# Altium footprint library PCB_ConnectorHDR.PcbLib: 221 footprints (part 6 of 14)
Each footprint in its own frame and in the unit in brackets; x right, y up, seen from the top. Pads: shape width x height; smd on the part's side, far side on the other; paste and mask are expansions set on the pad; w line width, h text height; cw(c..) or ccw(c..) is an arc to the next point about the centre after c.
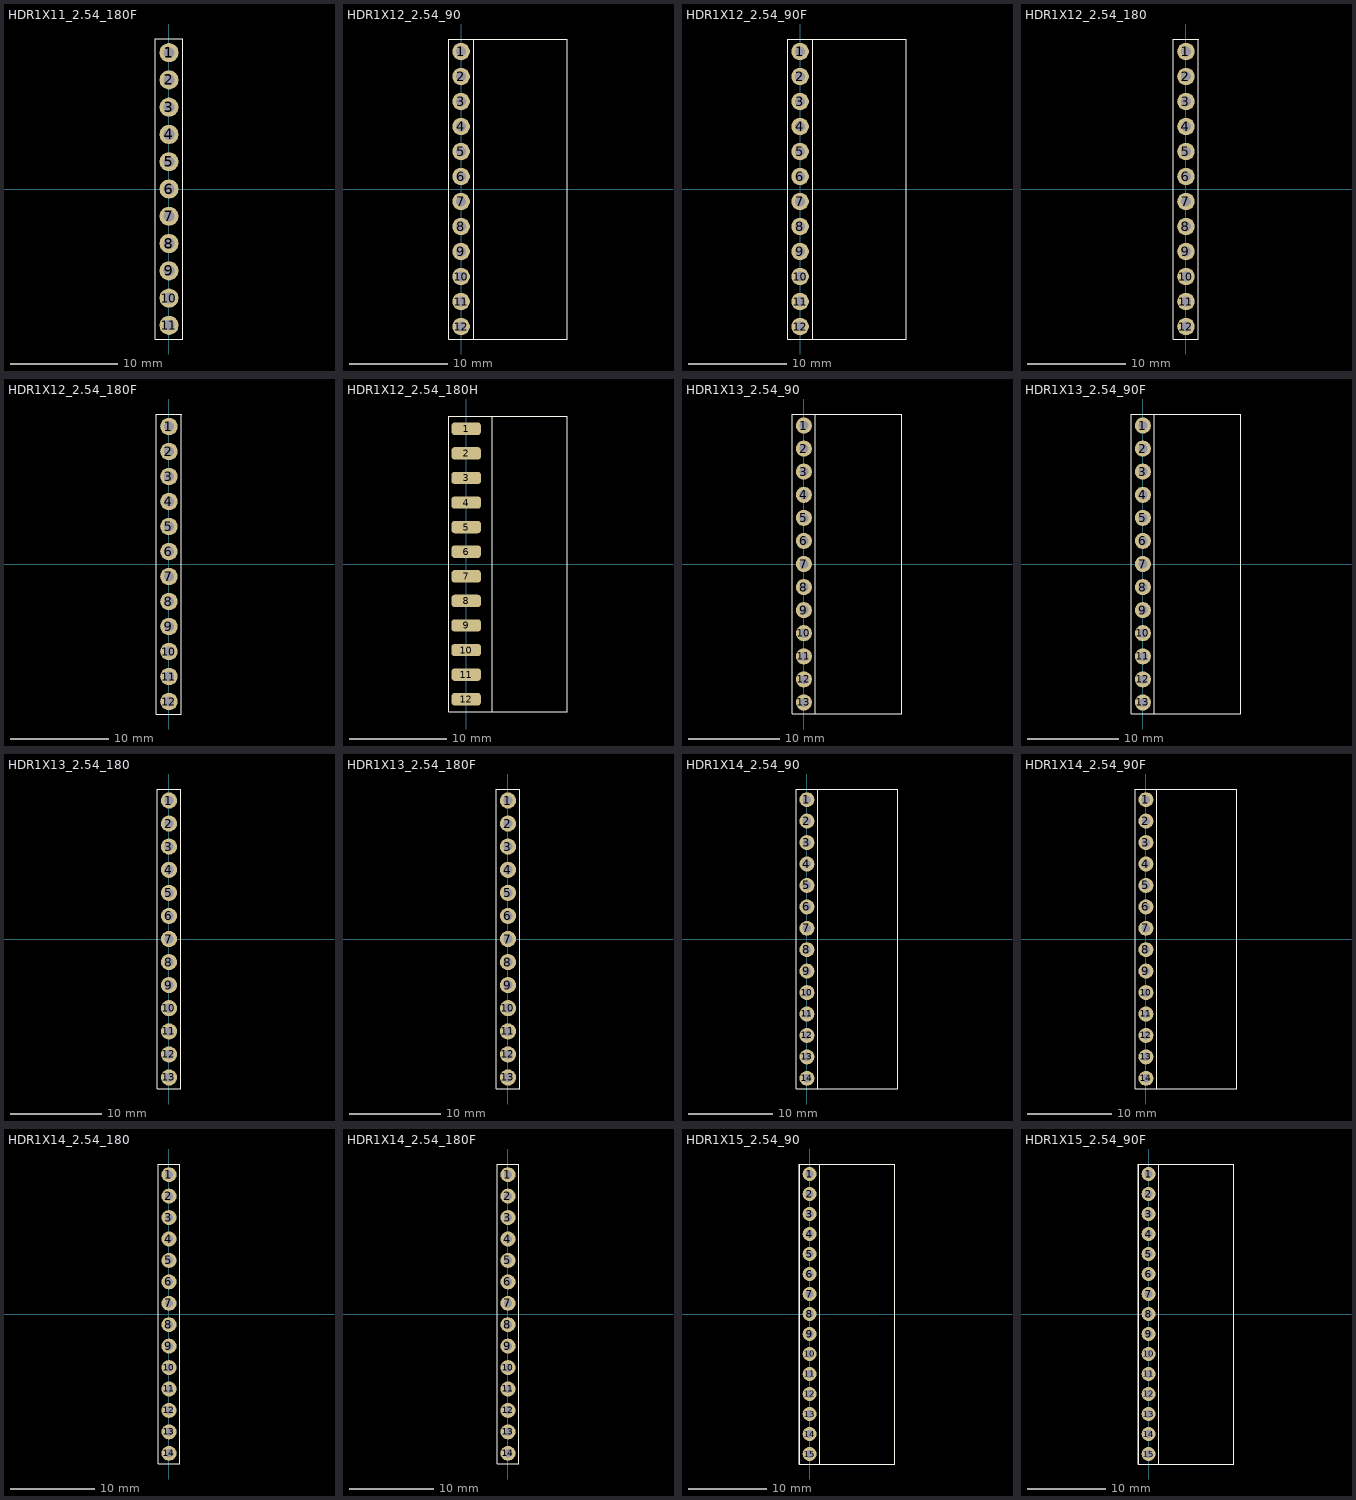
[diagram p5: the footprints below, top view; thin cyan lines are the x and y axes]

## HDR1X11_2.54_180F [mil]
height 169.29
pads (11):
  round 70 hole 39.37: 1(0,500) 2(0,400) 3(0,300) 4(0,200) 5(0,100) 6(0,0) 7(0,-100) 8(0,-200) 9(0,-300) 10(0,-400) 11(0,-500)
Top Overlay:
  lines w2: -50,-550 -50,550 ; -50,-550 50,-550 ; -50,-550 -50,550 ; -50,-550 50,-550 ; -50,550 50,550 ; -50,550 50,550 ; 50,-550 50,550 ; 50,-550 50,550
3D body "female_header_a-bl254-eg-g11d.stp": height 334.65, standoff -125.98, extent -49.21,-554.84 49.21,555

## HDR1X12_2.54_90 [mil]
height 169.29
pads (12):
  round 70 hole 39.37: 1(0,550) 2(0,450) 3(0,350) 4(0,250) 5(0,150) 6(0,50) 7(0,-50) 8(0,-150) 9(0,-250) 10(0,-350) 11(0,-450) 12(0,-550)
Top Overlay:
  lines w2: -50,-600 425,-600 425,600 -50,600 ; -50,-600 -50,600 ; -50,-600 50,-600 50,600 -50,600 ; -50,-600 -50,600
3D body "pin_header_aw140-ea-g12g.stp": height 99.21, standoff -93.7, extent -15,-596.06 423.58,596.06

## HDR1X12_2.54_90F [mil]
height 169.29
pads (12):
  round 70 hole 39.37: 1(0,550) 2(0,450) 3(0,350) 4(0,250) 5(0,150) 6(0,50) 7(0,-50) 8(0,-150) 9(0,-250) 10(0,-350) 11(0,-450) 12(0,-550)
Top Overlay:
  lines w2: -50,-600 425,-600 425,600 -50,600 ; -50,-600 -50,600 ; -50,-600 50,-600 50,600 -50,600 ; -50,-600 -50,600
3D body "female_header_a-bl254-ea-g12d.stp": height 98.93, standoff -125.48, extent -9,-604.84 387.06,605

## HDR1X12_2.54_180 [mil]
height 169.29
pads (12):
  round 70 hole 39.37: 1(0,550) 2(0,450) 3(0,350) 4(0,250) 5(0,150) 6(0,50) 7(0,-50) 8(0,-150) 9(0,-250) 10(0,-350) 11(0,-450) 12(0,-550)
Top Overlay:
  lines w2: -50,-600 50,-600 ; -50,-600 -50,600 ; -50,-600 50,-600 ; -50,-600 -50,600 ; -50,600 50,600 ; -50,600 50,600 ; 50,-600 50,600 ; 50,-600 50,600
3D body "pin_header_aw140-eg-g12d.stp": height 322.83, standoff -118.11, extent -49.18,-600 49.18,600

## HDR1X12_2.54_180F [mil]
height 169.29
pads (12):
  round 70 hole 39.37: 1(0,550) 2(0,450) 3(0,350) 4(0,250) 5(0,150) 6(0,50) 7(0,-50) 8(0,-150) 9(0,-250) 10(0,-350) 11(0,-450) 12(0,-550)
Top Overlay:
  lines w2: -50,-600 50,-600 ; -50,-600 -50,600 ; -50,-600 50,-600 ; -50,-600 -50,600 ; -50,600 50,600 ; -50,600 50,600 ; 50,-600 50,600 ; 50,-600 50,600
3D body "female_header_a-bl254-eg-g12d.stp": height 334.65, standoff -125.98, extent -49.21,-604.92 49.21,604.92

## HDR1X12_2.54_180H [mil]
height 169.29
pads (12):
  rrect50% 120x50 smd: 1(0,550) 2(0,450) 3(0,350) 4(0,250) 5(0,150) 6(0,50) 7(0,-50) 8(0,-150) 9(0,-250) 10(0,-350) 11(0,-450) 12(0,-550)
Top Overlay:
  lines w2: -70,-600 410,-600 410,600 -70,600 ; -70,-600 -70,600 ; -70,-600 -70,600 ; -70,-600 105,-600 105,600 -70,600
3D body "pin_header_aw140-eg-g12d.stp": height 49.32, standoff -49.05, extent -35,-600 405.94,600

## HDR1X13_2.54_90 [mil]
height 169.29
pads (13):
  round 70 hole 39.37: 1(0,600) 2(0,500) 3(0,400) 4(0,300) 5(0,200) 6(0,100) 7(0,0) 8(0,-100) 9(0,-200) 10(0,-300) 11(0,-400) 12(0,-500) 13(0,-600)
Top Overlay:
  lines w2: -51,-450 -51,650 ; -51,650 -51,-650 425,-650 425,650 -51,650 ; -50,-650 -50,650 ; -50,-650 50,-650 ; -50,-650 -50,650 ; -50,-650 50,-650 ; -50,650 50,650 ; -50,650 50,650 ; 50,-650 50,650 ; 50,-650 50,650
3D body "pin_header_aw140-ea-g13g.stp": height 98.93, standoff -93.99, extent -12,-646.13 426.58,646

## HDR1X13_2.54_90F [mil]
height 169.29
pads (13):
  round 70 hole 39.37: 1(0,600) 2(0,500) 3(0,400) 4(0,300) 5(0,200) 6(0,100) 7(0,0) 8(0,-100) 9(0,-200) 10(0,-300) 11(0,-400) 12(0,-500) 13(0,-600)
Top Overlay:
  lines w2: -51,-450 -51,650 ; -51,650 -51,-650 425,-650 425,650 -51,650 ; -50,-650 -50,650 ; -50,-650 50,-650 ; -50,-650 -50,650 ; -50,-650 50,-650 ; -50,650 50,650 ; -50,650 50,650 ; 50,-650 50,650 ; 50,-650 50,650
3D body "female_header_a-bl254-ea-g13d.stp": height 98.93, standoff -125.48, extent -8,-655.84 388.06,654

## HDR1X13_2.54_180 [mil]
height 169.29
pads (13):
  round 70 hole 39.37: 1(0,600) 2(0,500) 3(0,400) 4(0,300) 5(0,200) 6(0,100) 7(0,0) 8(0,-100) 9(0,-200) 10(0,-300) 11(0,-400) 12(0,-500) 13(0,-600)
Top Overlay:
  lines w2: -50,-650 -50,650 ; -50,-650 50,-650 ; -50,-650 50,-650 ; -50,-650 -50,650 ; -50,650 50,650 ; -50,650 50,650 ; 50,-650 50,650 ; 50,-650 50,650
3D body "pin_header_aw140-eg-g13d.stp": height 322.83, standoff -118.11, extent -49.18,-650 49.18,650

## HDR1X13_2.54_180F [mil]
height 169.29
pads (13):
  round 70 hole 39.37: 1(0,600) 2(0,500) 3(0,400) 4(0,300) 5(0,200) 6(0,100) 7(0,0) 8(0,-100) 9(0,-200) 10(0,-300) 11(0,-400) 12(0,-500) 13(0,-600)
Top Overlay:
  lines w2: -50,-650 50,-650 ; -50,-650 -50,650 ; -50,-650 -50,650 ; -50,-650 50,-650 ; -50,650 50,650 ; -50,650 50,650 ; 50,-650 50,650 ; 50,-650 50,650
3D body "female_header_a-bl254-eg-g13d.stp": height 334.65, standoff -125.98, extent -49.2,-654.91 49.22,654.92

## HDR1X14_2.54_90 [mil]
height 169.29
pads (14):
  round 70 hole 39.37: 1(0,650) 2(0,550) 3(0,450) 4(0,350) 5(0,250) 6(0,150) 7(0,50) 8(0,-50) 9(0,-150) 10(0,-250) 11(0,-350) 12(0,-450) 13(0,-550) 14(0,-650)
Top Overlay:
  lines w2: -51,-400 -51,700 ; -51,700 425,700 425,-700 -51,-700 -51,700 ; -50,-700 50,-700 ; -50,-700 -50,700 ; -50,-700 50,-700 ; -50,-700 -50,700 ; -50,700 50,700 ; -50,700 50,700 ; 50,-700 50,700 ; 50,-700 50,700
3D body "pin_header_aw140-ea-g14g.stp": height 98.93, standoff -93.99, extent -12.96,-696.06 425.62,696.07

## HDR1X14_2.54_90F [mil]
height 169.29
pads (14):
  round 70 hole 39.37: 1(0,650) 2(0,550) 3(0,450) 4(0,350) 5(0,250) 6(0,150) 7(0,50) 8(0,-50) 9(0,-150) 10(0,-250) 11(0,-350) 12(0,-450) 13(0,-550) 14(0,-650)
Top Overlay:
  lines w2: -51,-400 -51,700 ; -51,700 -51,-700 425,-700 425,700 -51,700 ; -50,-700 -50,700 ; -50,-700 50,-700 ; -50,-700 -50,700 ; -50,-700 50,-700 ; -50,700 50,700 ; -50,700 50,700 ; 50,-700 50,700 ; 50,-700 50,700
3D body "female_header_a-bl254-ea-g14d.stp": height 98.93, standoff -125.48, extent -7,-704.84 389.06,705

## HDR1X14_2.54_180 [mil]
height 169.29
pads (14):
  round 70 hole 39.37: 1(0,650) 2(0,550) 3(0,450) 4(0,350) 5(0,250) 6(0,150) 7(0,50) 8(0,-50) 9(0,-150) 10(0,-250) 11(0,-350) 12(0,-450) 13(0,-550) 14(0,-650)
Top Overlay:
  lines w2: -50,-700 -50,700 ; -50,-700 50,-700 ; -50,-700 -50,700 ; -50,-700 50,-700 ; -50,700 50,700 ; -50,700 50,700 ; 50,-700 50,700 ; 50,-700 50,700
3D body "pin_header_aw140-eg-g14d.stp": height 322.83, standoff -118.11, extent -49.18,-700 49.18,700

## HDR1X14_2.54_180F [mil]
height 169.29
pads (14):
  round 70 hole 39.37: 1(0,650) 2(0,550) 3(0,450) 4(0,350) 5(0,250) 6(0,150) 7(0,50) 8(0,-50) 9(0,-150) 10(0,-250) 11(0,-350) 12(0,-450) 13(0,-550) 14(0,-650)
Top Overlay:
  lines w2: -50,-700 50,-700 ; -50,-700 -50,700 ; -50,-700 50,-700 ; -50,-700 -50,700 ; -50,700 50,700 ; -50,700 50,700 ; 50,-700 50,700 ; 50,-700 50,700
3D body "female_header_a-bl254-eg-g14d.stp": height 334.65, standoff -125.98, extent -49.21,-704.84 49.21,705

## HDR1X15_2.54_90 [mil]
height 169.29
pads (15):
  round 70 hole 39.37: 1(0,700) 2(0,600) 3(0,500) 4(0,400) 5(0,300) 6(0,200) 7(0,100) 8(0,0) 9(0,-100) 10(0,-200) 11(0,-300) 12(0,-400) 13(0,-500) 14(0,-600) 15(0,-700)
Top Overlay:
  lines w2: -51,-350 -51,750 ; -51,750 425,750 425,-750 -51,-750 -51,750 ; -50,-750 50,-750 ; -50,-750 -50,750 ; -50,-750 50,-750 ; -50,-750 -50,750 ; -50,750 50,750 ; -50,750 50,750 ; 50,-750 50,750 ; 50,-750 50,750
3D body "pin_header_aw140-ea-g15g.stp": height 98.93, standoff -93.99, extent -13,-746.13 425.58,746

## HDR1X15_2.54_90F [mil]
height 169.29
pads (15):
  round 70 hole 39.37: 1(0,700) 2(0,600) 3(0,500) 4(0,400) 5(0,300) 6(0,200) 7(0,100) 8(0,0) 9(0,-100) 10(0,-200) 11(0,-300) 12(0,-400) 13(0,-500) 14(0,-600) 15(0,-700)
Top Overlay:
  lines w2: -51,-350 -51,750 ; -51,750 425,750 425,-750 -51,-750 -51,750 ; -50,-750 50,-750 ; -50,-750 -50,750 ; -50,-750 50,-750 ; -50,-750 -50,750 ; -50,750 50,750 ; -50,750 50,750 ; 50,-750 50,750 ; 50,-750 50,750
3D body "female_header_a-bl254-ea-g15d.stp": height 98.93, standoff -125.48, extent -7,-754.84 389.06,755